# Altium footprint library Supernova Connectors.PcbLib: 303 footprints (part 5 of 19)
Each footprint in its own frame and in the unit in brackets; x right, y up, seen from the top. Pads: shape width x height; smd on the part's side, far side on the other; paste and mask are expansions set on the pad; w line width, h text height; cw(c..) or ccw(c..) is an arc to the next point about the centre after c.
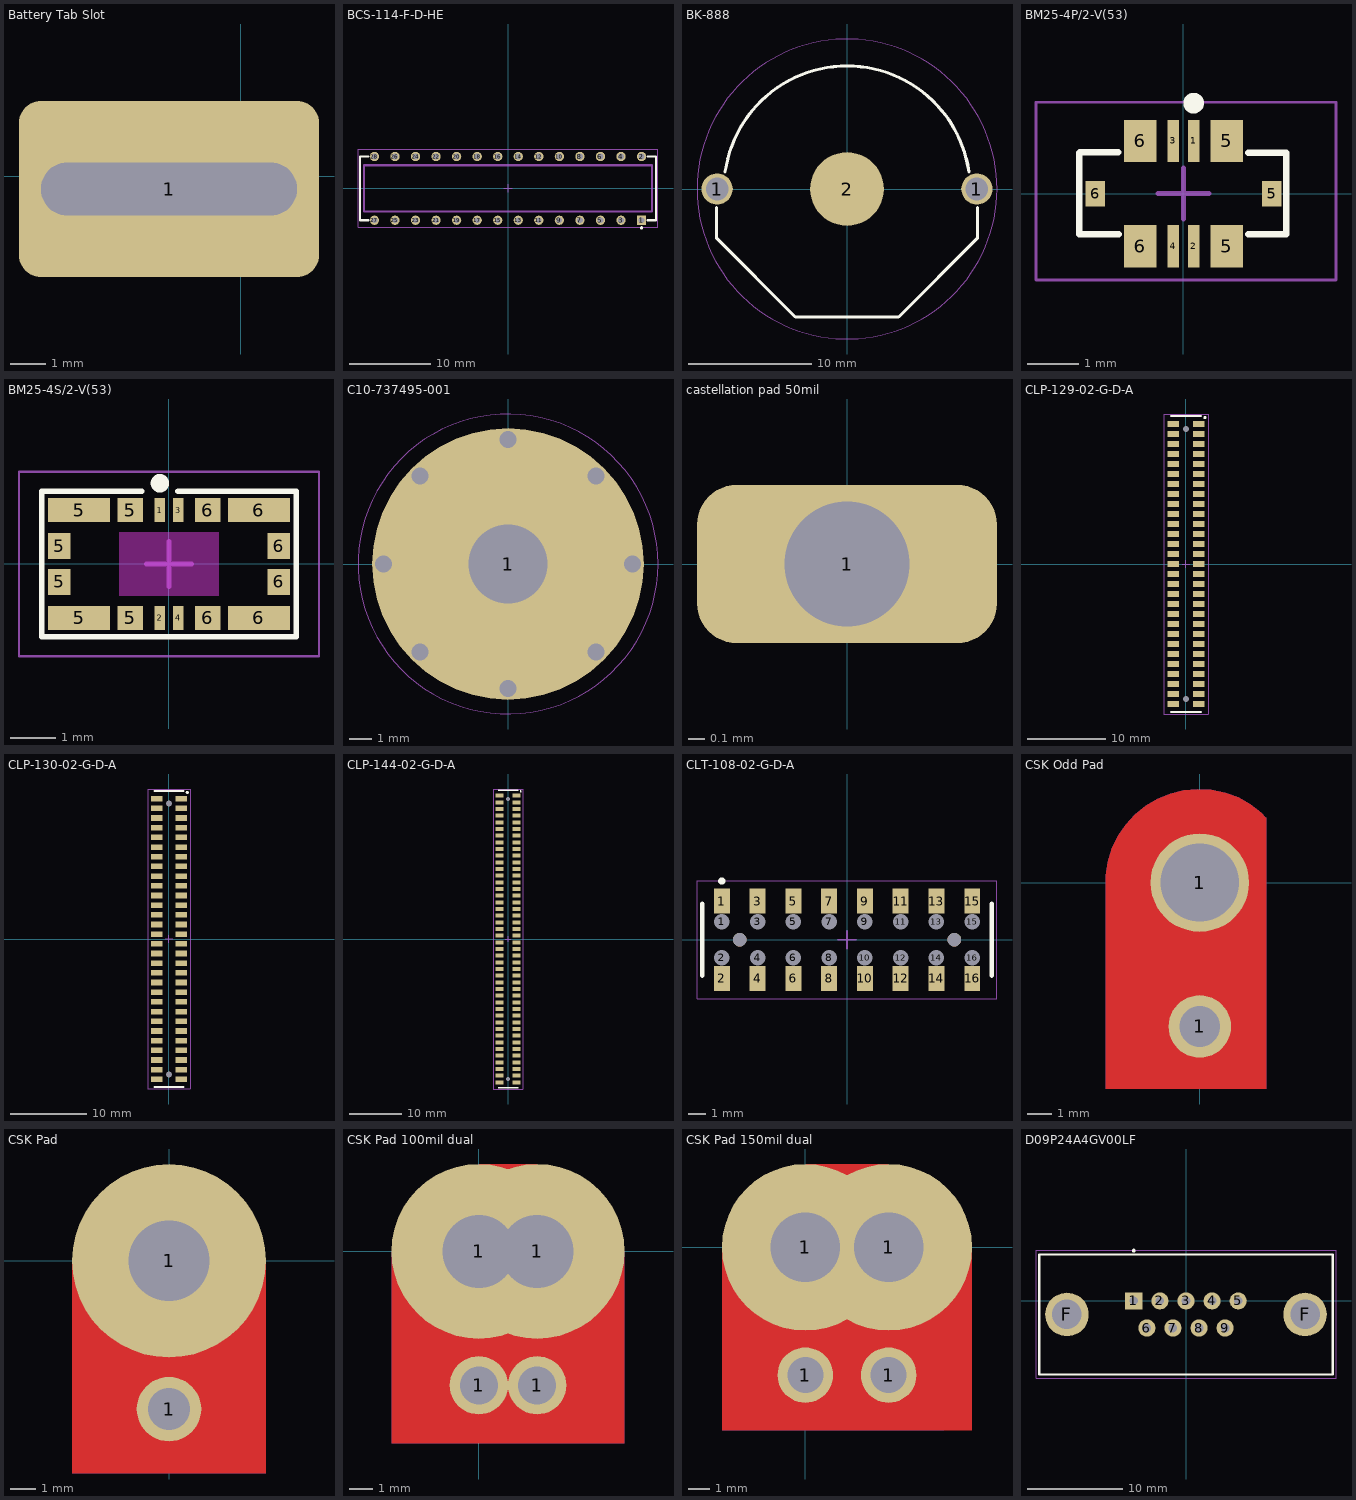
[diagram p4: the footprints below, top view; thin cyan lines are the x and y axes]

## Battery Tab Slot [mm] "Slot - 1.5mm x 7.25mm"
pads (1):
  rrect25% 8.5x5 hole 1.5 slot 7.25 at 0 deg: 1(-2.029,-0.356)

## BCS-114-F-D-HE [mil] "BCS-114-F-D-HE"
height 435.04
pads (28):
  rect 45x45 hole 28 mask+3: 1(650,-155)
  round 45 hole 28 mask+3: 2(650,155) 3(550,-155) 4(550,155) 5(450,-155) 6(450,155) 7(350,-155) 8(350,155) 9(250,-155) 10(250,155) 11(150,-155) 12(150,155) 13(50,-155) 14(50,155) 15(-50,-155) 16(-50,155) 17(-150,-155) 18(-150,155) 19(-250,-155) 20(-250,155) 21(-350,-155) 22(-350,155) 23(-450,-155) 24(-450,155) 25(-550,-155) 26(-550,155) 27(-650,-155) 28(-650,155)
Top Overlay:
  circle w8: c650,-192.05 r4
  lines w10: -680,-155 -720,-155 -720,155 -680,155 ; 680,-155 720,-155 720,155 680,155
Top 3D Body:
  lines w10: -700,-112.5 -700,112.5 700,112.5 700,-112.5 -700,-112.5
Top Courtyard:
  lines w1.97: -730,-190 -730,190 730,190 730,-190 -730,-190
  lines w3.94: -19.68,0 19.68,0 ; 0,-19.68 0,19.69
3D body "BCS-114-F-D-HE.stp": height 210, standoff -140, extent -700,-160 700,160

## BK-888 [mm]
pads (3):
  round 2.54 hole 1.85: 1(-10.555,0) 1(10.555,0)
  round 6 smd paste-3: 2(0,0)
Top Overlay:
  lines w0.254: -10.6,-1.5 -10.6,-4 -4.2,-10.4 4.2,-10.4 10.6,-4 10.6,-1.5 ; -9.901,1.4 cw(c0,0) 9.903,1.386
Top Courtyard:
  circle w0.05: c0,0 r12.192
  lines w0.1: -0.5,0 0.5,0 ; 0,-0.5 0,0.5
3D body "79523211 (rev1).stp": height 4.1, standoff -2.02, extent -11.299,-10.25 11.299,9.35

## BM25-4P/2-V(53) [mm]
pads (10):
  rect 0.23x0.83 smd mask+0.025: 1(0.2,1.035) 2(0.2,-1.035) 3(-0.2,1.035) 4(-0.2,-1.035)
  rect 0.64x0.83 smd paste-0.05 mask+0.025: 5(0.85,-1.035) 5(0.85,1.035) 6(-0.85,-1.035) 6(-0.85,1.035)
  rect 0.38x0.5 smd mask+0.025: 5(1.735,0) 6(-1.735,0)
Top Overlay:
  circle w0.203: c0.2,1.778 r0.102
  lines w0.127: -2.05,-0.8 -2.05,0.8 ; -2.035,0.808 -1.285,0.808 ; -2.025,-0.8 -1.275,-0.8 ; 1.27,-0.803 2.02,-0.803 ; 1.275,0.8 2.025,0.8 2.025,-0.8
Top Courtyard:
  lines w0.05: -2.9,-1.7 -2.9,1.8 3,1.8 3,-1.7 -2.9,-1.7
  lines w0.1: -0.5,0 0.5,0 ; 0,-0.5 0,0.5
3D body "BM25-4P.stp": height 0.6, standoff 0, extent -1.975,-1.3 1.955,1.3

## BM25-4S/2-V(53) [mm]
pads (16):
  rect 0.23x0.53 smd mask+0.025: 1(-0.2,1.185) 2(-0.2,-1.185) 3(0.2,1.185) 4(0.2,-1.185)
  rect 0.49x0.58 smd mask+0.025: 5(-2.415,-0.395) 5(-2.415,0.395) 6(2.415,-0.395) 6(2.415,0.395)
  rect 1.36x0.53 smd paste-0.05 mask+0.025: 5(-1.98,-1.185) 5(-1.98,1.185) 6(1.98,-1.185) 6(1.98,1.185)
  rect 0.56x0.53 smd mask+0.025: 5(-0.85,-1.185) 5(-0.85,1.185) 6(0.85,-1.185) 6(0.85,1.185)
Top Layer keep-out:
  region: -1.1,0.7 -1.1,-0.7 1.1,-0.7 1.1,0.7
Top Overlay:
  circle w0.203: c-0.2,1.778 r0.102
  lines w0.127: -0.6,1.6 -2.8,1.6 -2.8,-1.6 2.8,-1.6 2.8,1.6 0.2,1.6
Top Courtyard:
  lines w0.05: -3.302,-2.032 3.302,-2.032 3.302,2.032 -3.302,2.032 -3.302,-2.032
  lines w0.1: -0.5,0 0.5,0 ; 0,-0.5 0,0.5
3D body "BM25-4S.stp": height 0.7, standoff 0, extent -2.5,-1.3 2.5,1.3

## C10-737495-001 [mm]
pads (1):
  round 12 hole 3.5 mask+0.102: 1(0,0)
via 3.889,-3.889 diameter 0.9 hole 0.76
via -3.889,-3.889 diameter 0.9 hole 0.76
via -3.889,3.889 diameter 0.9 hole 0.76
via 5.5,0 diameter 0.9 hole 0.76
via 0,5.5 diameter 0.9 hole 0.76
via -5.5,0 diameter 0.9 hole 0.76
via 0,-5.5 diameter 0.9 hole 0.76
via 3.889,3.889 diameter 0.9 hole 0.76
Top Paste:
  region: 0.5,4.973 0.5,2.526 0.678,2.484 1.022,2.363 1.346,2.195 1.643,1.983 1.907,1.73 2.132,1.443 2.315,1.127 2.451,0.789 2.538,0.434 2.574,0.071 2.558,-0.294 2.491,-0.653 2.438,-0.828 2.437,-0.83 4.558,-2.054 4.559,-2.052 4.681,-1.783 4.858,-1.219 4.968,-0.638 5.008,-0.049 4.979,0.541 4.881,1.124 4.715,1.691 4.483,2.235 4.188,2.747 3.835,3.221 3.429,3.651 2.976,4.029 2.48,4.351 1.951,4.613 1.394,4.811 0.817,4.942 0.523,4.973
  region: -4.556,-2.053 -2.438,-0.83 -2.49,-0.655 -2.558,-0.296 -2.574,0.068 -2.539,0.432 -2.452,0.786 -2.316,1.125 -2.134,1.441 -1.909,1.729 -1.645,1.981 -1.348,2.194 -1.025,2.362 -0.68,2.484 -0.503,2.525 -0.5,2.525 -0.5,4.975 -0.503,4.975 -0.796,4.945 -1.373,4.817 -1.931,4.621 -2.462,4.362 -2.959,4.042 -3.414,3.665 -3.822,3.237 -4.177,2.765 -4.473,2.254 -4.707,1.711 -4.876,1.145 -4.977,0.562 -5.009,-0.028 -4.971,-0.617 -4.863,-1.199 -4.688,-1.763 -4.568,-2.033
  region: 4.056,-2.919 1.938,-1.696 1.812,-1.829 1.536,-2.067 1.228,-2.263 0.896,-2.414 0.545,-2.517 0.184,-2.568 -0.181,-2.569 -0.543,-2.517 -0.893,-2.415 -1.226,-2.265 -1.534,-2.069 -1.811,-1.831 -1.936,-1.698 -1.937,-1.696 -4.058,-2.92 -4.057,-2.923 -3.884,-3.162 -3.485,-3.598 -3.037,-3.983 -2.546,-4.313 -2.021,-4.583 -1.467,-4.789 -0.893,-4.929 -0.306,-4.999 0.285,-5.001 0.872,-4.932 1.447,-4.795 2.001,-4.591 2.528,-4.324 3.02,-3.996 3.47,-3.612 3.871,-3.179 4.045,-2.94
  lines w0.254: -4.568,-2.033 cw(c0,0) -0.503,4.975 ; -4.556,-2.053 -2.438,-0.83 cw(c0,0) -0.503,2.525 ; -0.5,2.525 -0.5,4.975
Top Courtyard:
  circle w0.05: c0,0 r6.63
  lines w0.1: -0.5,0 0.5,0 ; 0,-0.5 0,0.5

## castellation pad 50mil [mm]
pads (1):
  rrect50% 1.8x0.95 hole 0.75: 1(0,0)

## CLP-129-02-G-D-A [mm]
pads (60):
  rect 1.47x0.74 smd: 1(1.615,17.779) 2(-1.615,17.779) 3(1.615,16.509) 4(-1.615,16.509) 5(1.615,15.239) 6(-1.615,15.239) 7(1.615,13.969) 8(-1.615,13.969) 9(1.615,12.699) 10(-1.615,12.699) 11(1.615,11.429) 12(-1.615,11.429) 13(1.615,10.159) 14(-1.615,10.159) 15(1.615,8.889) 16(-1.615,8.889) 17(1.615,7.619) 18(-1.615,7.619) 19(1.615,6.349) 20(-1.615,6.349) 21(1.615,5.079) 22(-1.615,5.079) 23(1.615,3.809) 24(-1.615,3.809) 25(1.615,2.539) 26(-1.615,2.539) 27(1.615,1.269) 28(-1.615,1.269) 29(1.615,-0.001) 30(-1.615,-0.001) 31(1.615,-1.271) 32(-1.615,-1.271) 33(1.615,-2.541) 34(-1.615,-2.541) 35(1.615,-3.811) 36(-1.615,-3.811) 37(1.615,-5.081) 38(-1.615,-5.081) 39(1.615,-6.351) 40(-1.615,-6.351) 41(1.615,-7.621) 42(-1.615,-7.621) 43(1.615,-8.891) 44(-1.615,-8.891) 45(1.615,-10.161) 46(-1.615,-10.161) 47(1.615,-11.431) 48(-1.615,-11.431) 49(1.615,-12.701) 50(-1.615,-12.701) 51(1.615,-13.971) 52(-1.615,-13.971) 53(1.615,-15.241) 54(-1.615,-15.241) 55(1.615,-16.511) 56(-1.615,-16.511) 57(1.615,-17.781) 58(-1.615,-17.781)
  round 0.508 hole 0.74 unplated: ""(0.003,-17.146) ""(0.003,17.144)
Top Overlay:
  circle w0.203: c2.4,18.6 r0.102
  lines w0.254: -1.905,-18.815 1.905,-18.815 ; -1.905,18.815 1.905,18.815
Top Courtyard:
  lines w0.05: -2.8,-19.05 2.8,-19.05 2.8,19.05 -2.8,19.05 -2.8,-19.05
  lines w0.1: -0.5,0 0.5,0 ; 0,-0.5 0,0.5
3D body "CLP-129-02-G-D-A.stp": height 2.28, standoff -0.49, extent -2.159,-18.631 2.159,18.631

## CLP-130-02-G-D-A [mm]
pads (62):
  rect 1.47x0.74 smd: 1(1.615,18.415) 2(-1.615,18.415) 3(1.615,17.145) 4(-1.615,17.145) 5(1.615,15.875) 6(-1.615,15.875) 7(1.615,14.605) 8(-1.615,14.605) 9(1.615,13.335) 10(-1.615,13.335) 11(1.615,12.065) 12(-1.615,12.065) 13(1.615,10.795) 14(-1.615,10.795) 15(1.615,9.525) 16(-1.615,9.525) 17(1.615,8.255) 18(-1.615,8.255) 19(1.615,6.985) 20(-1.615,6.985) 21(1.615,5.715) 22(-1.615,5.715) 23(1.615,4.445) 24(-1.615,4.445) 25(1.615,3.175) 26(-1.615,3.175) 27(1.615,1.905) 28(-1.615,1.905) 29(1.615,0.635) 30(-1.615,0.635) 31(1.615,-0.635) 32(-1.615,-0.635) 33(1.615,-1.905) 34(-1.615,-1.905) 35(1.615,-3.175) 36(-1.615,-3.175) 37(1.615,-4.445) 38(-1.615,-4.445) 39(1.615,-5.715) 40(-1.615,-5.715) 41(1.615,-6.985) 42(-1.615,-6.985) 43(1.615,-8.255) 44(-1.615,-8.255) 45(1.615,-9.525) 46(-1.615,-9.525) 47(1.615,-10.795) 48(-1.615,-10.795) 49(1.615,-12.065) 50(-1.615,-12.065) 51(1.615,-13.335) 52(-1.615,-13.335) 53(1.615,-14.605) 54(-1.615,-14.605) 55(1.615,-15.875) 56(-1.615,-15.875) 57(1.615,-17.145) 58(-1.615,-17.145) 59(1.615,-18.415) 60(-1.615,-18.415)
  round 0.508 hole 0.74 unplated: ""(0.003,-17.78) ""(0.003,17.78)
Top Overlay:
  circle w0.203: c2.4,19.236 r0.102
  lines w0.254: -1.905,-19.449 1.905,-19.449 ; -1.905,19.451 1.905,19.451
Top Courtyard:
  lines w0.05: -2.8,-19.684 2.8,-19.684 2.8,19.686 -2.8,19.686 -2.8,-19.684
  lines w0.1: -0.5,0.001 0.5,0.001 ; 0,-0.499 0,0.501
3D body "CLP-130-02-G-D-A.stp": height 2.28, standoff -0.49, extent -2.159,-19.265 2.159,19.267

## CLP-144-02-G-D-A [mm]
pads (90):
  rect 1.47x0.74 smd: 1(1.615,27.305) 2(-1.615,27.305) 3(1.615,26.035) 4(-1.615,26.035) 5(1.615,24.765) 6(-1.615,24.765) 7(1.615,23.495) 8(-1.615,23.495) 9(1.615,22.225) 10(-1.615,22.225) 11(1.615,20.955) 12(-1.615,20.955) 13(1.615,19.685) 14(-1.615,19.685) 15(1.615,18.415) 16(-1.615,18.415) 17(1.615,17.145) 18(-1.615,17.145) 19(1.615,15.875) 20(-1.615,15.875) 21(1.615,14.605) 22(-1.615,14.605) 23(1.615,13.335) 24(-1.615,13.335) 25(1.615,12.065) 26(-1.615,12.065) 27(1.615,10.795) 28(-1.615,10.795) 29(1.615,9.525) 30(-1.615,9.525) 31(1.615,8.255) 32(-1.615,8.255) 33(1.615,6.985) 34(-1.615,6.985) 35(1.615,5.715) 36(-1.615,5.715) 37(1.615,4.445) 38(-1.615,4.445) 39(1.615,3.175) 40(-1.615,3.175) 41(1.615,1.905) 42(-1.615,1.905) 43(1.615,0.635) 44(-1.615,0.635) 45(1.615,-0.635) 46(-1.615,-0.635) 47(1.615,-1.905) 48(-1.615,-1.905) 49(1.615,-3.175) 50(-1.615,-3.175) 51(1.615,-4.445) 52(-1.615,-4.445) 53(1.615,-5.715) 54(-1.615,-5.715) 55(1.615,-6.985) 56(-1.615,-6.985) 57(1.615,-8.255) 58(-1.615,-8.255) 59(1.615,-9.525) 60(-1.615,-9.525) 61(1.615,-10.795) 62(-1.615,-10.795) 63(1.615,-12.065) 64(-1.615,-12.065) 65(1.615,-13.335) 66(-1.615,-13.335) 67(1.615,-14.605) 68(-1.615,-14.605) 69(1.615,-15.875) 70(-1.615,-15.875) 71(1.615,-17.145) 72(-1.615,-17.145) 73(1.615,-18.415) 74(-1.615,-18.415) 75(1.615,-19.685) 76(-1.615,-19.685) 77(1.615,-20.955) 78(-1.615,-20.955) 79(1.615,-22.225) 80(-1.615,-22.225) 81(1.615,-23.495) 82(-1.615,-23.495) 83(1.615,-24.765) 84(-1.615,-24.765) 85(1.615,-26.035) 86(-1.615,-26.035) 87(1.615,-27.305) 88(-1.615,-27.305)
  round 0.508 hole 0.74 unplated: ""(0.003,-26.67) ""(0.003,26.67)
Top Overlay:
  circle w0.203: c2.406,28.126 r0.102
  lines w0.254: -1.905,-28.341 1.905,-28.341 ; -1.905,28.341 1.905,28.341
Top Courtyard:
  lines w0.05: -2.8,-28.575 2.8,-28.575 2.8,28.575 -2.8,28.575 -2.8,-28.575
  lines w0.1: -0.5,0 0.5,0 ; 0,-0.5 0,0.5
3D body "CLP-144-02-G-D-A.stp": height 2.28, standoff -0.49, extent -2.159,-28.156 2.159,28.156

## CLT-108-02-G-D-A [mil]
pads (34):
  round 30 hole 34 unplated mask+0: 1(-275.43,39.37) 2(-275.43,-39.38) 3(-196.73,39.37) 4(-196.73,-39.38) 5(-118.03,39.37) 6(-118.03,-39.38) 7(-39.33,39.37) 8(-39.33,-39.38) 9(39.37,39.37) 10(39.37,-39.38) 11(118.07,39.37) 12(118.07,-39.38) 13(196.77,39.37) 14(196.77,-39.38) 15(275.47,39.37) 16(275.47,-39.38)
  rect 35x55 smd: 1(-275.43,85) 2(-275.43,-85) 3(-196.73,85) 4(-196.73,-85) 5(-118.03,85) 6(-118.03,-85) 7(-39.33,85) 8(-39.33,-85) 9(39.37,85) 10(39.37,-85) 11(118.07,85) 12(118.07,-85) 13(196.77,85) 14(196.77,-85) 15(275.47,85) 16(275.47,-85)
  round 30 hole 30 unplated mask+0: ""(-236.08,0) ""(236.12,0)
Top Overlay:
  circle w8: c-275.43,129.06 r4
  lines w10: -318.9,-78.74 -318.9,78.74 ; 318.94,-78.75 318.94,78.73
Top Courtyard:
  lines w1.97: -330,-130 -330,130 330,130 330,-130 -330,-130
  lines w3.94: -19.68,0 19.68,0 ; 0,-19.68 0,19.69
3D body "CLT-108-02-G-D-A.stp": height 89.41, standoff -24.09, extent -314.95,-101.49 314.97,101.51

## CSK Odd Pad [mm]
pads (2):
  round 2.54 hole 1.651: 1(0,-5.842)
  round 4 hole 3.175: 1(0,0)
Top Layer:
  region: 2.692,-8.382 -3.81,-8.382 -3.81,0 -3.811,0.281 -3.729,0.838 -3.566,1.376 -3.325,1.884 -3.012,2.352 -2.633,2.767 -2.197,3.123 -1.713,3.409 -1.192,3.621 -0.646,3.754 -0.085,3.805 0.476,3.772 1.027,3.657 1.554,3.461 2.047,3.19 2.494,2.848 2.69,2.647 2.692,2.647
Bottom Layer:
  region: 2.692,-8.382 -3.81,-8.382 -3.81,0 -3.811,0.281 -3.729,0.838 -3.566,1.376 -3.325,1.884 -3.012,2.352 -2.633,2.767 -2.197,3.123 -1.713,3.409 -1.192,3.621 -0.646,3.754 -0.085,3.805 0.476,3.772 1.027,3.657 1.554,3.461 2.047,3.19 2.494,2.848 2.69,2.647 2.692,2.647

## CSK Pad [mil]
pads (2):
  round 100 hole 65: 1(0,-230)
  round 300 / inner round 157.48 / far side round 300 hole 125: 1(0,0)
Top Layer:
  region: -150,0 -150,-330 150,-330 150,0
Bottom Layer:
  region: -150,0 -150,-330 150,-330 150,0

## CSK Pad 100mil dual [mil]
pads (4):
  round 100 hole 65: 1(0,-230) 1(100,-230)
  round 300 / inner round 157.48 / far side round 300 hole 125: 1(0,0) 1(100,0)
Top Layer:
  region: -150,0 -150,-330 250,-330 250,0
  region: 0,150 0,0 100,0 100,150
Bottom Layer:
  region: -150,0 -150,-330 250,-330 250,0
  region: 0,150 0,0 100,0 100,150

## CSK Pad 150mil dual [mil]
pads (4):
  round 100 hole 65: 1(0,-230) 1(150,-230)
  round 300 / inner round 157.48 / far side round 300 hole 125: 1(0,0) 1(150,0)
Top Layer:
  region: -150,0 -150,-330 300,-330 300,0
  region: 0,150 0,0 150,0 150,150
Bottom Layer:
  region: -150,0 -150,-330 250,-330 250,0
  region: 0,150 0,0 100,0 100,150

## D09P24A4GV00LF [mm]
pads (11):
  rect 1.8x1.8 hole 0.9: 1(-5.48,0)
  round 1.8 hole 0.9: 2(-2.74,0) 3(0,0) 4(2.74,0) 5(5.48,0) 6(-4.11,-2.845) 7(-1.37,-2.845) 8(1.37,-2.845) 9(4.11,-2.845)
  round 4.572 hole 3.1: F(-12.497,-1.422) F(12.497,-1.422)
Top Overlay:
  circle w0.203: c-5.48,5.278 r0.102
  lines w0.254: -15.4,-7.725 15.41,-7.725 15.41,4.873 -15.4,4.873 -15.4,-7.725
Top Courtyard:
  lines w0.05: -15.748,-8.128 15.748,-8.128 15.748,5.334 -15.748,5.334 -15.748,-8.128
  lines w0.1: -0.5,0 0.5,0 ; 0,-0.5 0,0.5
3D body "d09pxxx6xvxx.stp": height 12, standoff -3.2, extent -15.525,-7.697 15.475,4.853